# Altium footprint library kalios.PcbLib: 404 footprints (part 3 of 26)
Each footprint in its own frame and in the unit in brackets; x right, y up, seen from the top. Pads: shape width x height; smd on the part's side, far side on the other; paste and mask are expansions set on the pad; w line width, h text height; cw(c..) or ccw(c..) is an arc to the next point about the centre after c.
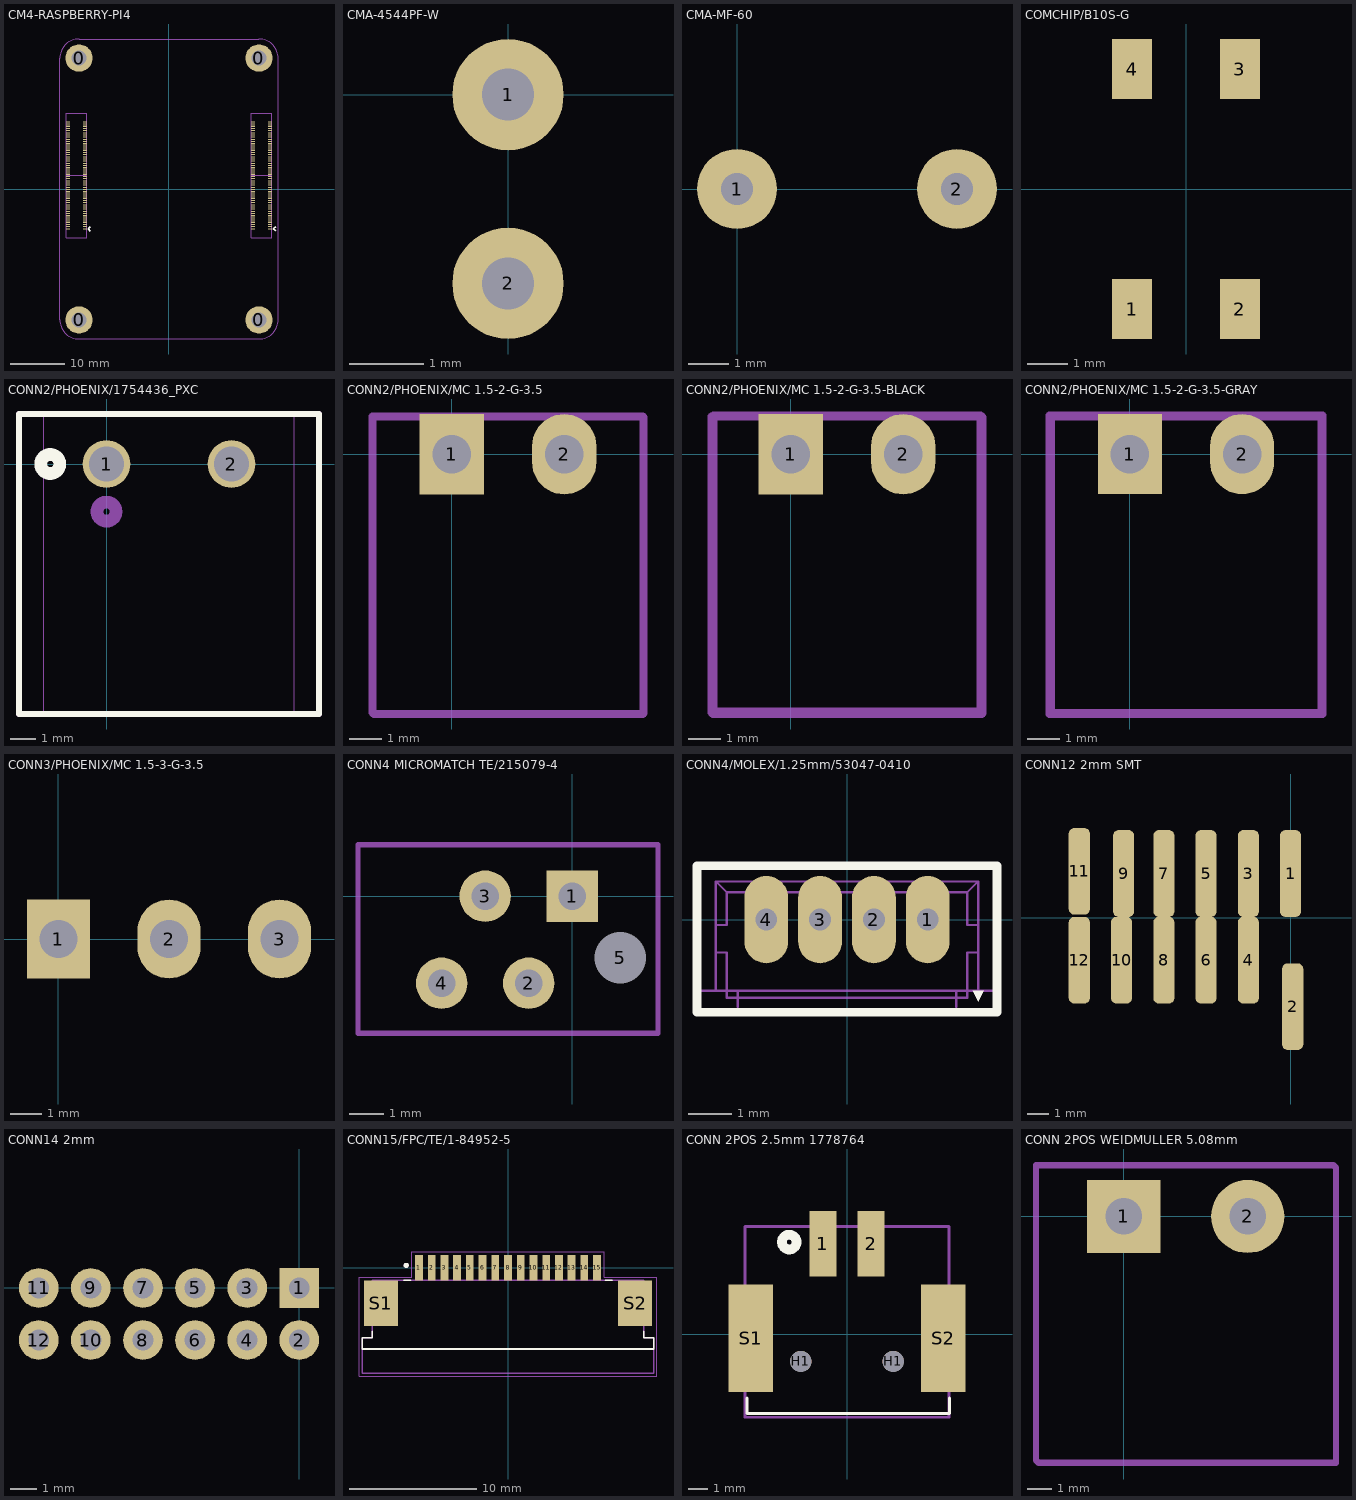
[diagram p2: the footprints below, top view; thin cyan lines are the x and y axes]

## CM4-RASPBERRY-PI4 [mm] "DF40C-100DS-0.4v by Amornthep Phunsin"
pads (204):
  round 5 hole 2.7: 0(-16.5,-24) 0(-16.5,24) 0(16.5,-24) 0(16.5,24)
  rect 0.7x0.2 smd: 1(18.5,-7.3) 2(15.42,-7.3) 3(18.5,-6.9) 4(15.42,-6.9) 5(18.5,-6.5) 6(15.42,-6.5) 7(18.5,-6.1) 8(15.42,-6.1) 9(18.5,-5.7) 10(15.42,-5.7) 11(18.5,-5.3) 12(15.42,-5.3) 13(18.5,-4.9) 14(15.42,-4.9) 15(18.5,-4.5) 16(15.42,-4.5) 17(18.5,-4.1) 18(15.42,-4.1) 19(18.5,-3.7) 20(15.42,-3.7) 21(18.5,-3.3) 22(15.42,-3.3) 23(18.5,-2.9) 24(15.42,-2.9) 25(18.5,-2.5) 26(15.42,-2.5) 27(18.5,-2.1) 28(15.42,-2.1) 29(18.5,-1.7) 30(15.42,-1.7) 31(18.5,-1.3) 32(15.42,-1.3) 33(18.5,-0.9) 34(15.42,-0.9) 35(18.5,-0.5) 36(15.42,-0.5) 37(18.5,-0.1) 38(15.42,-0.1) 39(18.5,0.3) 40(15.42,0.3) 41(18.5,0.7) 42(15.42,0.7) 43(18.5,1.1) 44(15.42,1.1) 45(18.5,1.5) 46(15.42,1.5) 47(18.5,1.9) 48(15.42,1.9) 49(18.5,2.3) 50(15.42,2.3) 51(18.5,2.7) 52(15.42,2.7) 53(18.5,3.1) 54(15.42,3.1) 55(18.5,3.5) 56(15.42,3.5) 57(18.5,3.9) 58(15.42,3.9) 59(18.5,4.3) 60(15.42,4.3) 61(18.5,4.7) 62(15.42,4.7) 63(18.5,5.1) 64(15.42,5.1) 65(18.5,5.5) 66(15.42,5.5) 67(18.5,5.9) 68(15.42,5.9) 69(18.5,6.3) 70(15.42,6.3) 71(18.5,6.7) 72(15.42,6.7) 73(18.5,7.1) 74(15.42,7.1) 75(18.5,7.5) 76(15.42,7.5) 77(18.5,7.9) 78(15.42,7.9) 79(18.5,8.3) 80(15.42,8.3) 81(18.5,8.7) 82(15.42,8.7) 83(18.5,9.1) 84(15.42,9.1) 85(18.5,9.5) 86(15.42,9.5) 87(18.5,9.9) 88(15.42,9.9) 89(18.5,10.3) 90(15.42,10.3) 91(18.5,10.7) 92(15.42,10.7) 93(18.5,11.1) 94(15.42,11.1) 95(18.5,11.5) 96(15.42,11.5) 97(18.5,11.9) 98(15.42,11.9) 99(18.5,12.3) 100(15.42,12.3) 101(-15.42,-7.3) 102(-18.5,-7.3) 103(-15.42,-6.9) 104(-18.5,-6.9) 105(-15.42,-6.5) 106(-18.5,-6.5) 107(-15.42,-6.1) 108(-18.5,-6.1) 109(-15.42,-5.7) 110(-18.5,-5.7) 111(-15.42,-5.3) 112(-18.5,-5.3) 113(-15.42,-4.9) 114(-18.5,-4.9) 115(-15.42,-4.5) 116(-18.5,-4.5) 117(-15.42,-4.1) 118(-18.5,-4.1) 119(-15.42,-3.7) 120(-18.5,-3.7) 121(-15.42,-3.3) 122(-18.5,-3.3) 123(-15.42,-2.9) 124(-18.5,-2.9) 125(-15.42,-2.5) 126(-18.5,-2.5) 127(-15.42,-2.1) 128(-18.5,-2.1) 129(-15.42,-1.7) 130(-18.5,-1.7) 131(-15.42,-1.3) 132(-18.5,-1.3) 133(-15.42,-0.9) 134(-18.5,-0.9) 135(-15.42,-0.5) 136(-18.5,-0.5) 137(-15.42,-0.1) 138(-18.5,-0.1) 139(-15.42,0.3) 140(-18.5,0.3) 141(-15.42,0.7) 142(-18.5,0.7) 143(-15.42,1.1) 144(-18.5,1.1) 145(-15.42,1.5) 146(-18.5,1.5) 147(-15.42,1.9) 148(-18.5,1.9) 149(-15.42,2.3) 150(-18.5,2.3) 151(-15.42,2.7) 152(-18.5,2.7) 153(-15.42,3.1) 154(-18.5,3.1) 155(-15.42,3.5) 156(-18.5,3.5) 157(-15.42,3.9) 158(-18.5,3.9) 159(-15.42,4.3) 160(-18.5,4.3) 161(-15.42,4.7) 162(-18.5,4.7) 163(-15.42,5.1) 164(-18.5,5.1) 165(-15.42,5.5) 166(-18.5,5.5) 167(-15.42,5.9) 168(-18.5,5.9) 169(-15.42,6.3) 170(-18.5,6.3) 171(-15.42,6.7) 172(-18.5,6.7) 173(-15.42,7.1) 174(-18.5,7.1) 175(-15.42,7.5) 176(-18.5,7.5) 177(-15.42,7.9) 178(-18.5,7.9) 179(-15.42,8.3) 180(-18.5,8.3) 181(-15.42,8.7) 182(-18.5,8.7) 183(-15.42,9.1) 184(-18.5,9.1) 185(-15.42,9.5) 186(-18.5,9.5) 187(-15.42,9.9) 188(-18.5,9.9) 189(-15.42,10.3) 190(-18.5,10.3) 191(-15.42,10.7) 192(-18.5,10.7) 193(-15.42,11.1) 194(-18.5,11.1) 195(-15.42,11.5) 196(-18.5,11.5) 197(-15.42,11.9) 198(-18.5,11.9) 199(-15.42,12.3) 200(-18.5,12.3)
Top Overlay:
  lines w0.254: -14.415,-7.704 -14.815,-7.304 ; -14.415,-6.904 -14.815,-7.304 ; 19.538,-7.688 19.138,-7.288 ; 19.538,-6.888 19.138,-7.288 ; -14.815,-7.304 -14.815,-7.304 ; 19.138,-7.288 19.138,-7.288
Fab Notes:
  lines w0.12: -18.83,2.5 -15.05,2.5 ; 15.07,2.5 18.85,2.5 ; -18.85,-8.9 -15.07,-8.9 -15.07,13.9 -18.85,13.9 -18.85,-8.9 ; 15.07,-8.9 15.07,13.9 18.85,13.9 18.85,-8.9 15.07,-8.9
  text "PCIe" at -18,-3.05 h0.7
  text "USB" at -16.9,-4.134 h0.7
  text "CAM1" at -16.9,0.75 h0.7
  text "HDMI1" at -18.1,5.958 h0.7
  text "ETH" at 16.5,-4.751 h0.7
  text "TV" at -17,-2.75 h0.7
  text "HDMI0" at -18,10.375 h0.7
  text "CAM0" at -18,0.783 h0.7
  text "5V" at 17,9.9 h0.7
  text "DSI0" at -16.9,6.95 h0.7
  text "DS1" at -17.5,13.05 h0.7
  text "1V8" at 15.8,11.225 h0.7
  text "3V3" at 15.8,8.625 h0.7
  text "SD" at 16.4,6.991 h0.7
  text "GPIO" at 16.5,0.625 h0.7
Top Courtyard:
  lines w0.12: -20,-24 ccw(c-16.5,-24) -16.5,-27.5 16.5,-27.5 ccw(c16.5,-24) 20,-24 20,24 ccw(c16.5,24) 16.5,27.5 -16.5,27.5 ccw(c-16.5,24) -20,24 -20,-24
Top Designator:
  text ".Designator" at -7.618,-0.508 h1.52
3D body "DF40C-100DS.stp": height 1.4, standoff -0.05, extent 15.31,-8.785 18.69,13.815
3D body "DF40C-100DS.stp": height 1.4, standoff -0.05, extent -18.69,-8.785 -15.31,13.815
3D body "cm4-rev1-3_new.STEP": height 5.15, standoff 0.37, extent -20,-27.5 20,27.5

## CMA-4544PF-W [mm]
pads (2):
  round 1.5 hole 0.7 unplated: 1(0,0) 2(0,-2.54)
Top Designator:
  text ".Designator" at -9.599,-1.822 h1.52
3D body "Pièce1.STEP": height 4.7, standoff -3, extent -6.822,-6.145 2.859,3.517

## CMA-MF-60 [mm]
pads (2):
  round 2 hole 0.8 unplated: 1(0,0) 2(5.5,0)
Top Designator:
  text ".Designator" at 11.682,6.479 h1.52
3D body "antenna.STEP": height 12.1, standoff -0.15, extent -10.7,2.8 49.3,15.076

## COMCHIP/B10S-G [mm]
pads (4):
  rect 1x1.5 smd: 1(-1.346,-3) 2(1.346,-3) 3(1.346,3) 4(-1.346,3)
Top Designator:
  text ".Designator" at -7.617,-0.508 h1.52
3D body "B05S-G.STEP": height 3.06, standoff 0, extent -2.35,-3.5 2.35,3.5

## CONN2/PHOENIX/1754436_PXC [mil]
pads (2):
  round 75 hole 55 mask+0: 1(0,0) 2(196.85,0)
Top Overlay:
  circle w20: c-88.58,0 r15
  lines w10: -137.8,-393.7 -137.8,78.74 334.65,78.74 334.65,-393.7 -137.8,-393.7
Top 3D Body:
  circle w20: c0,-75 r15
  lines w1: -98.57,-393.26 -98.57,78.74 295.43,78.74 295.43,-393.26 -98.57,-393.26
Top Courtyard:
  lines w10: -137.8,-393.7 -137.8,78.74 334.65,78.74 334.65,-393.7 -137.8,-393.7
Top Designator:
  text ".Designator" at -201.48,-177.47 h60
3D body "pxc_1757475_04_MSTBA-2-5-2-G_3D.stp": height 338.58, standoff -137.8, extent -137.44,-392.22 335,80.22
3D body: height 10, standoff 0, extent 0,0 10,10

## CONN2/PHOENIX/MC 1.5-2-G-3.5 [mm]
pads (2):
  rect 2x2.5 hole 1.2: 1(0,0)
  oval 2x2.5 hole 1.2: 2(3.5,0)
Top Assembly (Mech11):
  lines w0.254: -2.464,-8.026 -2.413,-8.077 ; 5.944,-8.077 5.969,-8.052 ; 5.944,1.168 5.969,1.143
Top Courtyard:
  lines w0.254: -2.464,-8.026 -2.464,1.168 ; -2.413,-8.077 5.944,-8.077 ; -2.413,1.168 5.944,1.168 ; 5.969,-8.052 5.969,1.143
Top Designator:
  text ".Designator" at -5.865,-3.934 h1.52
3D body "pxc_1844210_05_MC-1-5-2-G-3-5_3D.stp": height 7.25, standoff -3.4, extent -2.413,-8.029 5.987,1.171

## CONN2/PHOENIX/MC 1.5-2-G-3.5-BLACK [mm]
pads (2):
  rect 2x2.5 hole 1.2: 1(0,0)
  oval 2x2.5 hole 1.2: 2(3.5,0)
Top Assembly (Mech11):
  lines w0.254: -2.464,-8.026 -2.413,-8.077 ; 5.944,-8.077 5.969,-8.052 ; 5.944,1.168 5.969,1.143
Top 3D Body:
  lines w0.254: -2.4,-8 -2.4,1.2 5.9,1.2 5.9,-8 -2.4,-8
Top Courtyard:
  lines w0.254: -2.464,-8.026 -2.464,1.168 ; -2.413,-8.077 5.944,-8.077 ; -2.413,1.168 5.944,1.168 ; 5.969,-8.052 5.969,1.143
Top Designator:
  text ".Designator" at -1.746,-3.66 h0.7
3D body "pxc_1844210_05_MC-1-5-2-G-3-5_3Dblack.STEP": height 7.25, standoff -3.4, extent -2.439,-8 5.961,1.2

## CONN2/PHOENIX/MC 1.5-2-G-3.5-GRAY [mm]
pads (2):
  rect 2x2.5 hole 1.2: 1(0,0)
  oval 2x2.5 hole 1.2: 2(3.5,0)
Top Assembly (Mech11):
  lines w0.254: -2.464,-8.026 -2.413,-8.077 ; 5.944,-8.077 5.969,-8.052 ; 5.944,1.168 5.969,1.143
Top 3D Body:
  lines w0.254: -2.5,-8.1 -2.5,1.2 6,1.2 6,-8.1 -2.5,-8.1
Top Courtyard:
  lines w0.254: -2.464,-8.026 -2.464,1.168 ; -2.413,-8.077 5.944,-8.077 ; -2.413,1.168 5.944,1.168 ; 5.969,-8.052 5.969,1.143
Top Designator:
  text ".Designator" at -1.746,-3.66 h0.7
3D body "pxc_1844210_05_MC-1-5-2-G-3-5_3D.STEP": height 7.25, standoff -3.4, extent -2.5,-8 5.9,1.2

## CONN3/PHOENIX/MC 1.5-3-G-3.5 [mm]
pads (3):
  rect 2x2.5 hole 1.2: 1(0,0)
  oval 2x2.5 hole 1.2: 2(3.5,0) 3(7,0)
Top Designator:
  text ".Designator" at -4.119,-3.821 h1.52
3D body "mc_1.5-3-g-3.5.STEP": height 7.25, standoff -3.4, extent -2.451,-7.978 9.449,1.222

## CONN4 MICROMATCH TE/215079-4 [mm] "CONN4 MICROMATCH TE/215079-4"
pads (5):
  rect 1.5x1.5 hole 0.8: 1(0,0)
  round 1.5 hole 0.8: 2(-1.27,-2.54) 3(-2.54,0) 4(-3.81,-2.54)
  round 1.3 hole 1.5 unplated: 5(1.4,-1.8)
Top Courtyard:
  lines w0.15: -6.25,-4 2.5,-4 2.5,1.5 -5.75,1.5 -6.25,1.5 -6.25,-4
Top Designator:
  text ".Designator" at -9.493,-1.758 h1.52
3D body "C-0215079-04-3.STEP": height 4, standoff -3, extent -5.41,-3.74 1.6,1.26

## CONN4/MOLEX/1.25mm/53047-0410 [mil]
pads (4):
  oval 40x80 hole 20: 1(73.82,0) 2(24.61,0) 3(-24.61,0) 4(-73.82,0)
Top Overlay:
  region: 120,-75 115,-65 125,-65
  lines w8: -137.2,-84.65 137.2,-84.65 137.2,49.21 -137.2,49.21 -137.2,-84.65
Top 3D Body:
  region: -63.82,-20 -83.82,-20 -83.82,20 -63.82,20
  region: -14.61,-20 -34.61,-20 -34.61,20 -14.61,20
  region: 34.61,-20 14.61,-20 14.61,20 34.61,20
  region: 83.82,-20 63.82,-20 63.82,20 83.82,20
  lines w2: -133.94,-65 -120,-65 ; -100,-80 -100,-65 ; 100,-80 100,-65 ; 133.94,-65 120,-65 ; -120,-65 -110,-65 ; -120,-65 -120,-30 ; -120,-30 -120,-5 ; -120,-30 -110,-30 -110,-65 ; -120,-5 -120,35 ; -120,-5 -110,-5 -110,25 ; -120,35 120,35 ; -120,35 -110,25 ; -110,-65 -100,-65 ; -110,-65 -110,-71.5 110,-71.5 110,-65 ; -110,25 110,25 ; -100,-65 100,-65 ; 100,-65 110,-65 ; 110,-65 120,-65 ; 110,-65 110,-30 120,-30 ; 110,25 110,-5 120,-5 ; 110,25 120,35 ; 120,-65 120,-30 ; 120,-30 120,-5 ; 120,-5 120,35
Top Designator:
  text ".Designator" at -299.9,-37.71 h60
3D body "530470410.STEP": height 166.39, standoff -89.52, extent -132.87,-80 132.87,45.98

## CONN12 2mm SMT [mm] "98414-G06-12ULF"
pads (12):
  rrect50% 1x4.1 all layers, no hole: 1(0,2.1) 2(0.1,-4.2) 3(-2,2.1) 4(-2,-2) 5(-4,2.1) 6(-4,-2) 7(-6,2.1) 8(-6,-2) 9(-7.9,2.1) 10(-8,-2) 11(-10,2.2) 12(-10,-2)
Top Designator:
  text ".Designator" at -12.618,-1.508 h1.52
3D body "s98424-x52-12LF.STEP": height 5.85, standoff -0.6, extent -12,-5.5 2,3.5

## CONN14 2mm [mm] "98414-G06-12ULF"
pads (12):
  rect 1.524x1.524 hole 0.8: 1(0,0)
  round 1.524 hole 0.8: 2(0,-2) 3(-2,0) 4(-2,-2) 5(-4,0) 6(-4,-2) 7(-6,0) 8(-6,-2) 9(-8,0) 10(-8,-2) 11(-10,0) 12(-10,-2)
Top Designator:
  text ".Designator" at -12.618,-1.558 h1.52
3D body "AMPHENOL s98414-x06-12LF.STEP": height 5.85, standoff -2.5, extent -12,-4.1 2,2

## CONN15/FPC/TE/1-84952-5 [mm]
pads (17):
  rect 0.61x2 smd: 1(-7,0) 2(-6,0) 3(-5,0) 4(-4,0) 5(-3,0) 6(-2,0) 7(-1,0) 8(0,0) 9(1,0) 10(2,0) 11(3,0) 12(4,0) 13(5,0) 14(6,0) 15(7,0)
  rect 2.68x3.6 smd: S1(-9.99,-2.8) S2(9.99,-2.8)
Top Overlay:
  circle w0.2: c-8,0.17 r0.1
  lines w0.127: -10.675,-5 -10.675,-5.51 -11.46,-5.51 -11.46,-6.4 11.46,-6.4 11.46,-5.51 10.675,-5.51 10.675,-5 ; -8.2,-1 -7.64,-1 ; 7.64,-1 8.2,-1
Top 3D Body:
  circle w0.2: c-8,0.17 r0.1
  lines w0.127: -11.46,-6.4 -11.46,-5.51 -10.675,-5.51 -10.675,-1 10.675,-1 10.675,-5.51 11.46,-5.51 11.46,-6.4 ; -11.46,-6.4 11.46,-6.4 ; -11.46,-6.4 -11.46,-8.3 11.46,-8.3 11.46,-6.4
Top Courtyard:
  lines w0.05: -11.71,-8.55 -11.71,-0.75 -7.555,-0.75 -7.555,1.25 7.555,1.25 7.555,-0.75 11.71,-0.75 11.71,-8.55 -11.71,-8.55
Top Designator:
  text ".Designator" at -7.618,-4.158 h1.52
3D body "1-84952-5.STEP": height 2.54, standoff -0.02, extent -11.46,-6.491 11.46,0.049

## CONN 2POS 2.5mm 1778764 [mm] "TERM BLOCK HDR 2POS 90DEG 2.5MM"
pads (6):
  rect 1.397x3.404 smd paste+0 mask+0: 1(-1.25,4.725) 2(1.25,4.725)
  round 1.1 hole 1.1 unplated: H1(-2.4,-1.4) H1(2.4,-1.4)
  rect 2.311x5.588 smd: S1(-5,-0.2) S2(5,-0.2)
Top Overlay:
  circle w0.508: c-3,4.8 r0.381
  lines w0.152: -5.207,-3.302 -5.207,-4.1 5.334,-4.1 5.334,-3.302
Top Courtyard:
  lines w0.152: -5.31,-4.3 -5.31,5.6 5.31,5.6 5.31,-4.3 -5.31,-4.3
Top Designator:
  text ".Designator" at -7.618,0.518 h1.52
3D body "pxc_1778764_01_PTSM-0-5-2-HH-2-5-SMD-R32_3D.stp": height 5, standoff -0.7, extent -5.266,-4.242 5.334,5.258

## CONN 2POS WEIDMULLER 5.08mm [mm]
pads (2):
  rect 3x3 hole 1.5: 1(0,0)
  round 3 hole 1.5: 2(5.08,0)
Top Courtyard:
  lines w0.254: -3.6,-10 -3.6,2.1 8.6,2.1 8.7,2 8.7,-10.1 -3.5,-10.1 -3.6,-10
Top Designator:
  text ".Designator" at -0.949,-4.233 h0.7
3D body "1241060000.stp": height 9.4, standoff -3.2, extent -3.6,-10 8.56,2